# Altium footprint library SENSOR.PcbLib: 56 footprints (part 1 of 4)
Each footprint in its own frame and in the unit in brackets; x right, y up, seen from the top. Pads: shape width x height; smd on the part's side, far side on the other; paste and mask are expansions set on the pad; w line width, h text height; cw(c..) or ccw(c..) is an arc to the next point about the centre after c.
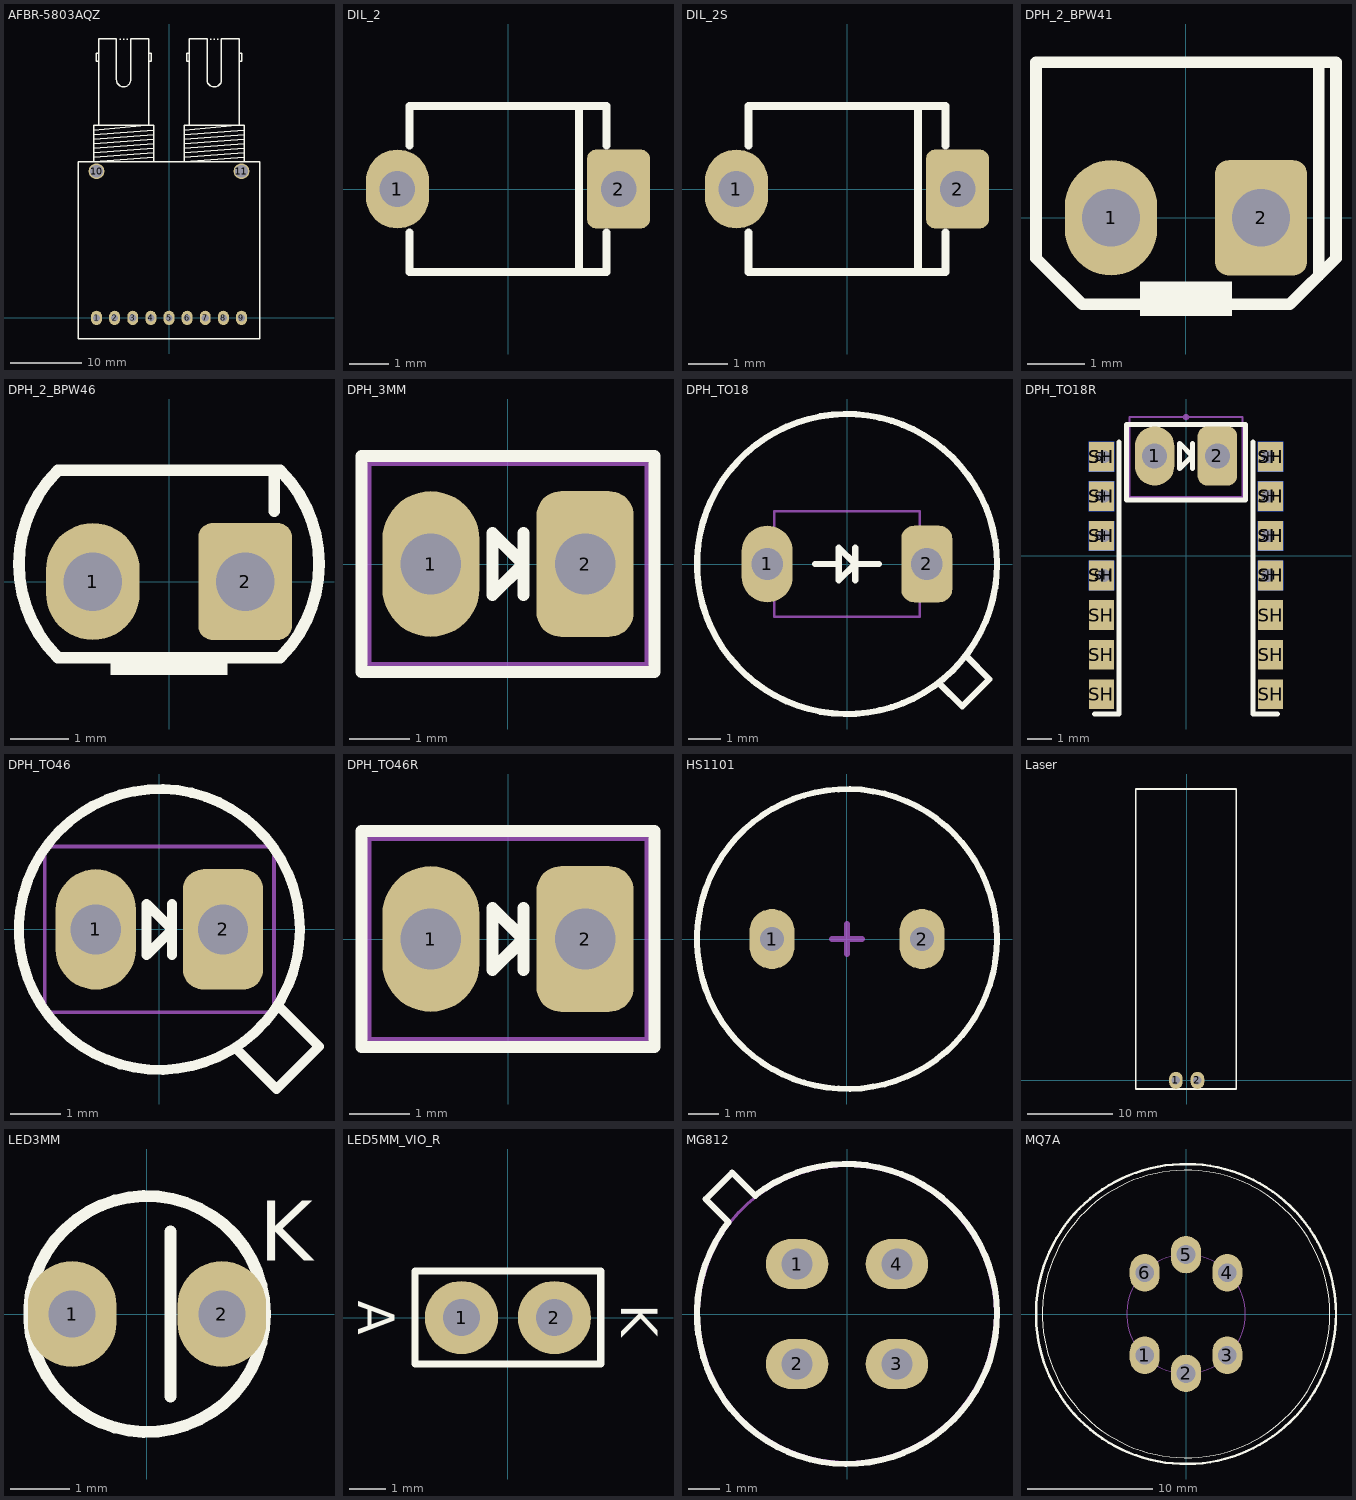
[diagram p0: the footprints below, top view; thin cyan lines are the x and y axes]

## AFBR-5803AQZ [mm] "FIBER OPTIC"
height 14.8
pads (11):
  oval 1.524x2 hole 1: 1(-10.16,0) 2(-7.62,0) 3(-5.08,0) 4(-2.54,0) 5(0,0) 6(2.54,0) 7(5.08,0) 8(7.62,0) 9(10.16,0)
  round 2.2 hole 1.8: 10(-10.16,20.54) 11(10.16,20.54)
Top Overlay:
  lines w0.2: -12.7,-2.965 12.7,-2.965 ; -12.7,-2.92 -12.7,21.88 12.7,21.88 12.7,-2.92 ; -10.559,23.15 -2.159,23.785 ; -10.559,23.785 -2.159,24.42 ; -10.559,24.42 -2.159,25.055 ; -10.559,25.055 -2.159,25.69 ; -10.559,25.69 -2.159,26.325 ; -10.559,26.325 -3.184,26.98 ; -10.55,22.515 -2.159,23.15 ; -9.859,35.985 -10.225,35.985 -10.225,37.085 -9.859,37.085 ; -7.359,33.378 ccw(c-6.359,33.378) -5.359,33.385 -5.359,39.08 -2.859,39.08 -2.859,26.98 -9.859,26.98 -9.859,39.08 -7.359,39.08 -7.359,33.378 ; -6.923,39.047 -6.796,39.047 ; -6.415,39.047 -6.288,39.047 ; -5.907,39.047 -5.78,39.047 ; -2.859,35.985 -2.478,35.985 -2.478,37.085 -2.859,37.085 ; -2.168,22.515 -10.559,21.88 ; 2.141,23.15 10.541,23.785 ; 2.141,23.785 10.541,24.42 ; 2.141,24.42 10.541,25.055 ; 2.141,25.055 10.541,25.69 ; 2.141,25.69 10.541,26.325 ; 2.141,26.325 9.516,26.98 ; 2.15,22.515 10.541,23.15 ; 2.841,35.985 2.475,35.985 2.475,37.085 2.841,37.085 ; 5.341,33.378 ccw(c6.341,33.378) 7.341,33.385 7.341,39.08 9.841,39.08 9.841,26.98 2.841,26.98 2.841,39.08 5.341,39.08 5.341,33.378 ; 5.777,39.047 5.904,39.047 ; 6.285,39.047 6.412,39.047 ; 6.793,39.047 6.92,39.047 ; 9.841,35.985 10.222,35.985 10.222,37.085 9.841,37.085 ; 10.532,22.515 2.141,21.88 ; -10.559,21.88 -2.159,21.88 -2.159,26.98 -10.559,26.98 -10.559,21.88 ; 2.141,21.88 10.541,21.88 10.541,26.98 2.141,26.98 2.141,21.88

## DIL_2 [mm] "Photodiode, Silicon PIN, BPW34"
pads (2):
  oval 1.6x2 hole 0.9: 1(-2.8,0)
  rrect30% 1.6x2 hole 0.9: 2(2.8,0)
Top Overlay:
  lines w0.2: -2.5,-1.1 -2.5,-2.1 2.5,-2.1 2.5,-1.1 ; -2.5,1.1 -2.5,2.1 2.5,2.1 2.5,1.1 ; 1.8,-2 1.8,2
3D body "BPW34B.STEP": height 2.85, standoff -2.52, extent -3.061,-2 3.061,2
3D body: height 2.83, standoff 2.42, extent -2,-1.7 2,1.7

## DIL_2S [mm] "Photodiode, Silicon PIN, BPW34S"
pads (2):
  oval 1.6x2 hole 0.9: 1(-2.8,0)
  rrect30% 1.6x2 hole 0.9: 2(2.8,0)
Top Overlay:
  lines w0.2: -2.5,-1.1 -2.5,-2.1 2.5,-2.1 2.5,-1.1 ; -2.5,1.1 -2.5,2.1 2.5,2.1 2.5,1.1 ; 1.8,-2 1.8,2
3D body "User Library-bpw34s.step": height 1.22, standoff 0, extent -3.204,-1.95 3.203,1.95

## DPH_2_BPW41 [mm] "Photodiode, Silicon PIN, BPW41"
pads (2):
  oval 1.6x2 hole 1: 1(-1.3,0)
  rrect30% 1.6x2 hole 1: 2(1.3,0)
Top Overlay:
  rectangle: -0.8,-1.7 0.8,-1.1
  lines w0.2: 2.3,-1 2.3,2.6 ; -2.6,-0.7 -2.6,2.7 2.6,2.7 2.6,-0.7 1.8,-1.5 -1.8,-1.5 -2.6,-0.7
3D body "User Library-BPW46.step": height 7.2, standoff -12.9, extent -2.5,-1.2 2.5,1.8

## DPH_2_BPW46 [mm] "Photodiode, Silicon PIN, BPW46"
pads (2):
  oval 1.6x2 hole 1: 1(-1.3,0)
  rrect30% 1.6x2 hole 1: 2(1.3,0)
Top Overlay:
  rectangle: -1,-1.6 1,-1.3
  lines w0.2: 1.8,1.2 1.8,1.9 ; -1.9,-1.3 cw(c-0.3,0.3) -1.9,1.9 1.9,1.9 cw(c0.3,0.3) 1.9,-1.3 -1.9,-1.3
3D body "User Library-BPW46.step": height 7.2, standoff -12.9, extent -2.5,-1.2 2.5,1.8

## DPH_3MM [mm] "PHOTO TRANSISTOR, LED 3mm dia lens, 0.100\" pitch"
height 13.335
pads (2):
  oval 1.6x2.4 hole 1: 1(-1.27,0)
  rrect50% 1.6x2.4 hole 1: 2(1.27,0)
Top Overlay:
  lines w0.2: 0.254,-0.508 0.254,0.508 ; -2.413,-1.778 -2.413,1.778 2.413,1.778 2.413,-1.778 -2.413,-1.778 ; -0.254,-0.508 0.254,0 -0.254,0.508 -0.254,-0.508
Mechanical 13:
  lines w0.076: -2.286,-1.651 -2.286,1.651 2.286,1.651 2.286,-1.651 -2.286,-1.651
3D body "LED_3mm_T1.stp": height 0.79, standoff -2.4, extent -1.597,-6.33 1.597,13.12

## DPH_TO18 [mm] "LED TO-18 TO-5 form"
height 13.335
pads (2):
  oval 1.6x2.4 hole 1: 1(-2.5,0)
  rrect50% 1.6x2.4 hole 1: 2(2.5,0)
Top Overlay:
  circle w0.2: c0,0 r4.7
  lines w0.2: -1,0 -0.254,0 ; 0.254,-0.508 0.254,0.508 ; 1,0 0.254,0 ; 2.899,-3.748 3.606,-4.455 4.455,-3.606 3.748,-2.899 ; 0.254,0 -0.254,-0.508 -0.254,0.508 0.254,0
Mechanical 13:
  lines w0.076: -2.286,-1.651 -2.286,1.651 2.286,1.651 2.286,-1.651 -2.286,-1.651
3D body "User Library-S2386-5K_norm.step": height 4.3, standoff -19.8, extent -4.55,-4.55 4.55,4.55

## DPH_TO18R [mil] "Photodiode TO-5 TO-18, edge straddling"
height 525
pads (33):
  round 10 on Mech15: 0(0,220.47)
  oval 62.99x94.49 hole 39.37: 1(-50,158.66)
  rrect50% 62.99x94.49 hole 39.37: 2(50,158.66)
  rect 40x47.24 smd: SH(-134.5,-31.5) SH(-134.5,-220.47) SH(-134.5,31.49) SH(-134.5,94.48) SH(-134.5,157.48) SH(-134.49,-157.48) SH(-134.49,-94.49) SH(134.49,-31.5) SH(134.5,-220.47) SH(134.5,31.49) SH(134.5,94.48) SH(134.5,157.48) SH(134.5,-157.48) SH(134.5,-94.49)
  rect 40x47.24 smd far side: SH(-134.5,-31.5) SH(-134.5,31.49) SH(-134.5,94.48) SH(-134.5,157.48) SH(134.49,-31.5) SH(134.5,31.49) SH(134.5,94.48) SH(134.5,157.48)
  round 32 hole 20: SH(-130.5,-31.5) SH(-130.5,31.49) SH(-130.5,94.48) SH(-130.5,157.48) SH(130.49,-31.5) SH(130.5,31.49) SH(130.5,94.48) SH(130.5,157.48)
Top Overlay:
  lines w7.87: -145.67,-251.97 -106.3,-251.97 -106.3,181.1 ; 10,138.66 10,178.66 ; 106.3,181.1 106.3,-251.97 145.67,-251.97 ; -95,88.66 -95,208.66 95,208.66 95,88.66 -95,88.66 ; -10,138.66 10,158.66 -10,178.66 -10,138.66
Mechanical 13:
  lines w3: -90,93.66 -90,220.47 90,220.47 90,93.66 -90,93.66
3D body "TO-5 custom with shield.stp": height 109.1, standoff -172.1, extent -140.32,-224.4 140.33,307.09

## DPH_TO46 [mm] "LED TO-46 form"
height 13.335
pads (2):
  oval 1.6x2.4 hole 1: 1(-1.27,0)
  rrect50% 1.6x2.4 hole 1: 2(1.27,0)
Top Overlay:
  circle w0.2: c0,0 r2.8
  lines w0.2: 0.254,-0.508 0.254,0.508 ; 1.556,-2.404 2.333,-3.182 3.182,-2.333 2.404,-1.556 ; -0.254,-0.508 0.254,0 -0.254,0.508 -0.254,-0.508
Mechanical 13:
  lines w0.076: -2.286,-1.651 -2.286,1.651 2.286,1.651 2.286,-1.651 -2.286,-1.651
3D body "TO-46 Edge straddling.stp": height 6.47, standoff -7.65, extent -2.778,-3.023 3.023,2.778

## DPH_TO46R [mm] "LED TO-46 form, edge straddling"
height 13.335
pads (2):
  oval 1.6x2.4 hole 1: 1(-1.27,0)
  rrect50% 1.6x2.4 hole 1: 2(1.27,0)
Top Overlay:
  lines w0.2: 0.254,-0.508 0.254,0.508 ; -2.413,-1.778 -2.413,1.778 2.413,1.778 2.413,-1.778 -2.413,-1.778 ; -0.254,-0.508 0.254,0 -0.254,0.508 -0.254,-0.508
Mechanical 13:
  lines w0.076: -2.286,-1.651 -2.286,1.651 2.286,1.651 2.286,-1.651 -2.286,-1.651
3D body "TO-46 Edge straddling.stp": height 1.96, standoff -3.82, extent -2.763,-0.228 3.023,13.89

## HS1101 [mm] "HUMIDITY SENSOR"
height 6
pads (2):
  oval 1.5x2 hole 0.8: 1(-2.5,0) 2(2.5,0)
Top Overlay:
  circle w0.2: c0,0 r5
Mechanical 13:
  lines w0.2: -0.5,0 0.5,0 ; 0,-0.5 0,0.5
3D body: height 0.4, standoff -5, extent 2.252,-0.249 2.75,0.25
3D body: height 0.4, standoff -5, extent -2.748,-0.249 -2.25,0.25
3D body: height 0.4, standoff 0.3, extent 0,0 5.05,5.05
3D body: height 0.4, standoff 0.3, extent 0,-5.05 5.05,0
3D body: height 0.4, standoff 0.3, extent -5.05,-5.05 0,0
3D body: height 0.4, standoff 0.3, extent -5.05,0 0,5.05
3D body: height 0.4, standoff 0.3, extent -4.9,-4.899 4.9,4.899
3D body: height 0.3, standoff 0, extent -5,-1.5 -4.5,0
3D body: height 2, standoff 0.4, extent -5,-4.998 5,4.999
3D body: height 6, standoff 0.4, extent -4.8,-4.799 4.8,4.799
3D body: height 3, standoff 2.5, extent -5,-4.998 5,4.999
3D body: height 4, standoff 3.5, extent -5,-4.998 5,4.999
3D body: height 5, standoff 4.5, extent -5,-4.998 5,4.999
3D body: height 6.2, standoff 5.5, extent -5,-4.998 5,4.999
3D body: height 0.3, standoff 0, extent -5,0 -4.5,1.5
3D body: height 0.3, standoff 0, extent -1.5,-5 0,-4.5
3D body: height 0.3, standoff 0, extent 0,-5 1.5,-4.5
3D body: height 0.3, standoff 0, extent 4.5,-1.5 5,0
3D body: height 0.3, standoff 0, extent 4.5,0 5,1.5
3D body: height 0.3, standoff 0, extent 0.1,4.5 1.6,5
3D body: height 0.3, standoff 0, extent -1.4,4.5 0.1,5

## Laser [mm] "Laser small bronze head (red)"
pads (2):
  oval 1.6x2 hole 1: 1(-1.27,0) 2(1.27,0)
Top Overlay:
  lines w0.2: -6,-1.016 -6,34.27 5.842,34.27 5.842,-1.016 -6,-1.016
3D body "laser.STEP": height 12, standoff 0, extent -6,1.27 6,36.47
3D body: height 6.13, standoff 5.87, extent -0.127,29.464 0.126,54.864

## LED3MM [mm] "LED THD 3MM"
pads (2):
  oval 1.5x1.8 hole 0.8: 1(-1.27,0) 2(1.27,0)
Top Overlay:
  circle w0.2: c0,0 r2
  lines w0.2: 0.4,-1.4 0.4,1.4
  text "K" at 1.9,0.9 h1.02
3D body "CircuitWorks-LED DIP 3MM.step": height 6.5, standoff -2, extent -1.895,-1.9 1.6,1.9

## LED5MM_VIO_R [mm] "LED THD 5MM VIOLET"
height 10
pads (2):
  round 2 hole 1: 1(-1.27,0) 2(1.27,0)
Top Overlay:
  lines w0.2: -2.54,-1.27 -2.54,1.27 2.54,1.27 2.54,-1.27 -2.54,-1.27
  text "K" at 3.101,0.363 h1
  text "A" at -4.099,0.463 h1
3D body "ir5.step": height 11.01, standoff 4.99, extent -2.475,-0.25 2.945,12.963
3D body "User Library-RM254_2pin.STEP": height 6.12, standoff -3, extent -2.575,-1.24 2.505,1.3

## MG812 [mm] "Sensor GAS, 9.4mm Diameter"
pads (4):
  oval 2x1.6 hole 1: 1(-1.6,1.6) 2(-1.6,-1.6) 3(1.6,-1.6) 4(1.6,1.6)
Top Overlay:
  lines w0.2: -3.791,2.944 ccw(c0,0) -2.942,3.793 ; -3.788,2.94 -4.525,3.677 -3.677,4.525 -2.936,3.784
Mechanical 1:
  circle w0.1: c0,0 r4.75
3D body: height 0.5, standoff 0, extent -4.699,-4.7 4.699,4.7
3D body: height 8, standoff 0, extent -3.999,-4 3.999,4
3D body: height -4, standoff -10, extent 1,-2 2,-1
3D body: height -4, standoff -10, extent 1,1 2,2
3D body: height -4, standoff -10, extent -2,1 -1,2
3D body: height -4, standoff -10, extent -2,-2 -1,-1
3D body: height 0.5, standoff 0, extent -4.384,2.796 -2.796,4.384

## MQ7A [mm] "Sensor GAS, 23.8mm Diameter"
pads (6):
  oval 2.4x3 hole 1.5: 1(-3.3,-3.3) 2(0,-4.75) 3(3.3,-3.3) 4(3.3,3.3) 5(0,4.75) 6(-3.3,3.3)
Top Overlay:
  circle w0.1: c0,0 r11.5
  circle w0.2: c0,0 r12
Mechanical 1:
  circle w0.1: c0,0 r4.75
3D body: height 24, standoff 18, extent -11.9,-11.897 11.9,11.897
3D body: height 18, standoff 6, extent -10.7,-10.697 10.7,10.697
3D body: height 1, standoff -5, extent -3.8,-3.8 -2.8,-2.8
3D body: height 1, standoff -5, extent -0.5,-5.25 0.5,-4.25
3D body: height 1, standoff -5, extent 2.8,-3.8 3.8,-2.8
3D body: height 1, standoff -5, extent 2.8,2.8 3.8,3.8
3D body: height 1, standoff -5, extent -0.5,4.25 0.5,5.25
3D body: height 1, standoff -5, extent -3.8,2.8 -2.8,3.8
3D body: height 6, standoff 0, extent -11.9,-11.897 11.9,11.897